# Altium schematic symbol library Sang_library.SchLib: 1607 symbols (part 11 of 15)
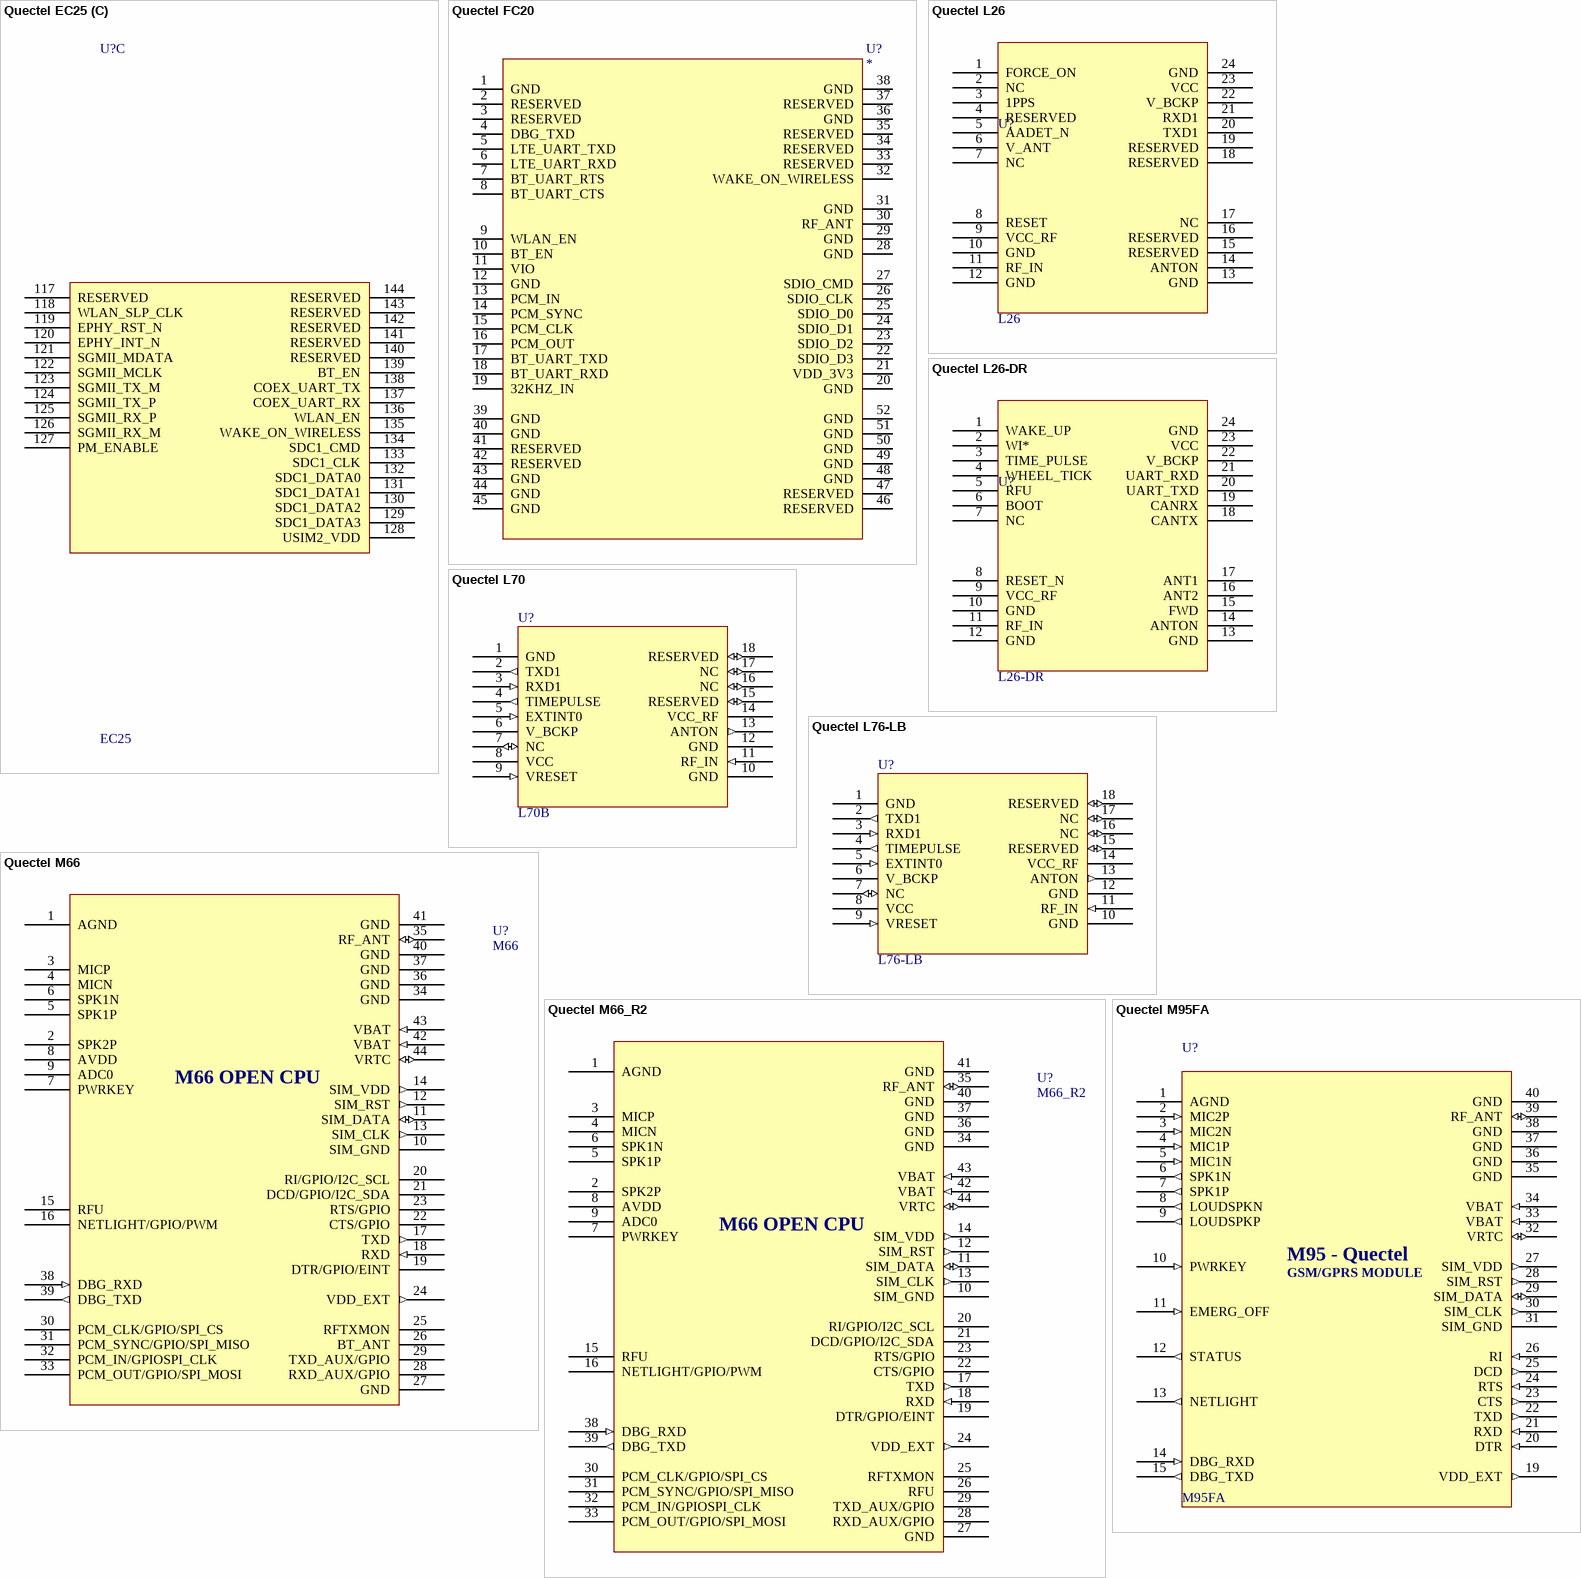
[diagram p107: symbols Quectel EC25 to Quectel M95FA]

## Quectel L26-DR
designator U?, comment L26-DR
GNSS Module Quectel L26-DR; Solder: SMT; Value: L26-DR; MPN: L26-DR; MFR: Quectel; Category: MODULE; PinCount: 24
footprint QUECTEL_L26 (Footprint not found)
pins: 1 WAKE_UP, 2 WI*, 3 TIME_PULSE, 4 WHEEL_TICK, 5 RFU, 6 BOOT, 7 NC, 8 RESET_N, 9 VCC_RF, 10 GND, 11 RF_IN, 12 GND, 13 GND, 14 ANTON, 15 FWD, 16 ANT2, 17 ANT1, 18 CANTX, 19 CANRX, 20 UART_TXD, 21 UART_RXD, 22 V_BCKP, 23 VCC, 24 GND

## Quectel L70
designator U?, comment L70B
GPS Module L70B, Quectel; Solder: SMT; Value: L70B; MPN: L70B; Category: MODULE
footprint GPS.L70
pins: 1 GND (power), 2 TXD1 (out), 3 RXD1 (in), 4 TIMEPULSE (out), 5 EXTINT0 (in), 6 V_BCKP (power), 7 NC (io), 8 VCC (power), 9 VRESET (in), 10 GND (power), 11 RF_IN (in), 12 GND (power), 13 ANTON (out), 14 VCC_RF (power), 15 RESERVED (io), 16 NC (io), 17 NC (io), 18 RESERVED (io)

## Quectel L76-LB
designator U?, comment L76-LB
GPS Module L76-LB, Quectel; Solder: SMT; Value: L76-LB; MPN: L76-LB; MFR: Quectel; Category: MODULE; PinCount: 18
footprint GPS.L7x (Footprint not found)
pins: 1 GND (power), 2 TXD1 (out), 3 RXD1 (in), 4 TIMEPULSE (out), 5 EXTINT0 (in), 6 V_BCKP (power), 7 NC (io), 8 VCC (power), 9 VRESET (in), 10 GND (power), 11 RF_IN (in), 12 GND (power), 13 ANTON (out), 14 VCC_RF (power), 15 RESERVED (io), 16 NC (io), 17 NC (io), 18 RESERVED (io)

## Quectel M66
designator U?, comment M66
GSM MODULE OPEN CPU; MFR: Quectel; Solder: SMT; MPN: M66; Value: M66; Category: MODULE
footprint M66
pins: 1 AGND (power), 2 SPK2P, 3 MICP, 4 MICN, 5 SPK1P, 6 SPK1N, 7 PWRKEY, 8 AVDD, 9 ADC0, 10 SIM_GND (power), 11 SIM_DATA (io), 12 SIM_RST (out), 13 SIM_CLK (out), 14 SIM_VDD (out), 15 RFU, 16 NETLIGHT/GPIO/PWM, 17 TXD (out), 18 RXD (in), 19 DTR/GPIO/EINT, 20 RI/GPIO/I2C_SCL, 21 DCD/GPIO/I2C_SDA, 22 CTS/GPIO, 23 RTS/GPIO, 24 VDD_EXT (out), 25 RFTXMON, 26 BT_ANT, 27 GND, 28 RXD_AUX/GPIO, 29 TXD_AUX/GPIO, 30 PCM_CLK/GPIO/SPI_CS, 31 PCM_SYNC/GPIO/SPI_MISO, 32 PCM_IN/GPIOSPI_CLK, 33 PCM_OUT/GPIO/SPI_MOSI, 34 GND, 35 RF_ANT (io), 36 GND (power), 37 GND (power), 38 DBG_RXD (in), 39 DBG_TXD (out), 40 GND (power), 41 GND (power), 42 VBAT (in), 43 VBAT (in), 44 VRTC (io)
text: M66 OPEN CPU

## Quectel M66_R2
designator U?, comment M66_R2
GSM MODULE OPEN CPU; MFR: Quectel; Solder: SMT; MPN: M66_R2; Value: M66_R2; Category: MODULE
footprint M66
pins: 1 AGND (power), 2 SPK2P, 3 MICP, 4 MICN, 5 SPK1P, 6 SPK1N, 7 PWRKEY, 8 AVDD, 9 ADC0, 10 SIM_GND (power), 11 SIM_DATA (io), 12 SIM_RST (out), 13 SIM_CLK (out), 14 SIM_VDD (out), 15 RFU, 16 NETLIGHT/GPIO/PWM, 17 TXD (out), 18 RXD (in), 19 DTR/GPIO/EINT, 20 RI/GPIO/I2C_SCL, 21 DCD/GPIO/I2C_SDA, 22 CTS/GPIO, 23 RTS/GPIO, 24 VDD_EXT (out), 25 RFTXMON, 26 RFU, 27 GND, 28 RXD_AUX/GPIO, 29 TXD_AUX/GPIO, 30 PCM_CLK/GPIO/SPI_CS, 31 PCM_SYNC/GPIO/SPI_MISO, 32 PCM_IN/GPIOSPI_CLK, 33 PCM_OUT/GPIO/SPI_MOSI, 34 GND, 35 RF_ANT (io), 36 GND (power), 37 GND (power), 38 DBG_RXD (in), 39 DBG_TXD (out), 40 GND (power), 41 GND (power), 42 VBAT (in), 43 VBAT (in), 44 VRTC (io)
text: M66 OPEN CPU

## Quectel M95FA
designator U?, comment M95FA
Quectel GSM & GPRS Module; Solder: SMT; MPN: M95FA; Value: M95FA; Category: MODULE
footprint M95FA
pins: 1 AGND (power), 2 MIC2P (in), 3 MIC2N (in), 4 MIC1P (in), 5 MIC1N (in), 6 SPK1N (out), 7 SPK1P (out), 8 LOUDSPKN (out), 9 LOUDSPKP (out), 10 PWRKEY (in), 11 EMERG_OFF (in), 12 STATUS (out), 13 NETLIGHT (out), 14 DBG_RXD (in), 15 DBG_TXD (out), 19 VDD_EXT (out), 20 DTR (in), 21 RXD (in), 22 TXD (out), 23 CTS (out), 24 RTS (in), 25 DCD (out), 26 RI (in), 27 SIM_VDD (out), 28 SIM_RST (out), 29 SIM_DATA (io), 30 SIM_CLK (out), 31 SIM_GND (power), 32 VRTC (io), 33 VBAT (in), 34 VBAT (in), 35 GND (power), 36 GND (power), 37 GND (power), 38 GND (power), 39 RF_ANT (io), 40 GND (power), 41 RESERVED (io) hidden, 42 RESERVED (io) hidden
text: M95 - Quectel; GSM/GPRS MODULE

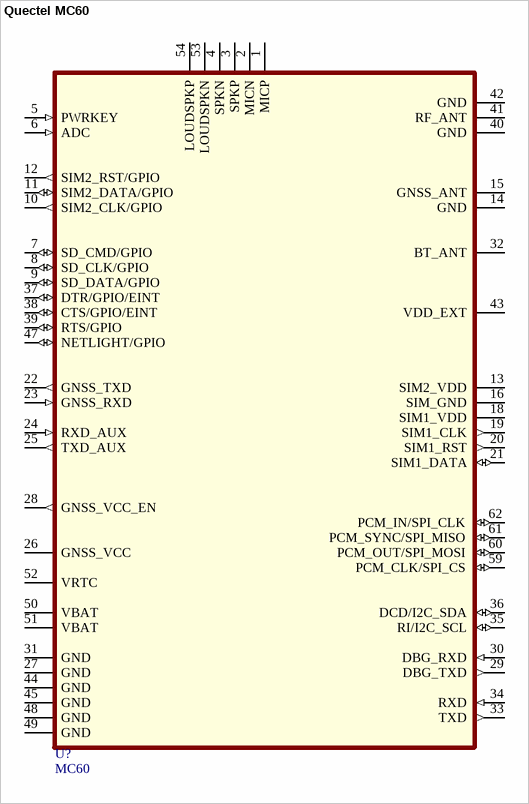
[diagram p65: symbol Quectel MC60]

## Quectel MC60
designator U?, comment MC60
GSM GNSS Module; Solder: SMT; MPN: MC60; Value: MC60; Category: MODULE
footprint MC60
pins: 1 MICP, 2 MICN, 3 SPKP, 4 SPKN, 5 PWRKEY (in), 6 ADC (in), 7 SD_CMD/GPIO (io), 8 SD_CLK/GPIO (io), 9 SD_DATA/GPIO (io), 10 SIM2_CLK/GPIO (out), 11 SIM2_DATA/GPIO (io), 12 SIM2_RST/GPIO (out), 13 SIM2_VDD (power), 14 GND (power), 15 GNSS_ANT, 16 SIM_GND (power), 18 SIM1_VDD (power), 19 SIM1_CLK (out), 20 SIM1_RST (out), 21 SIM1_DATA (io), 22 GNSS_TXD (out), 23 GNSS_RXD (in), 24 RXD_AUX (in), 25 TXD_AUX (out), 26 GNSS_VCC (power), 27 GND (power), 28 GNSS_VCC_EN (out), 29 DBG_TXD (out), 30 DBG_RXD (in), 31 GND (power), 32 BT_ANT, 33 TXD (out), 34 RXD (in), 35 RI/I2C_SCL (io), 36 DCD/I2C_SDA (io), 37 DTR/GPIO/EINT (io), 38 CTS/GPIO/EINT (io), 39 RTS/GPIO (io), 40 GND (power), 41 RF_ANT, 42 GND (power), 43 VDD_EXT, 44 GND (power), 45 GND (power), 47 NETLIGHT/GPIO (io), 48 GND (power), 49 GND (power), 50 VBAT (power), 51 VBAT (power), 52 VRTC (power), 53 LOUDSPKN, 54 LOUDSPKP, 59 PCM_CLK/SPI_CS (io), 60 PCM_OUT/SPI_MOSI (io), 61 PCM_SYNC/SPI_MISO (io), 62 PCM_IN/SPI_CLK (io)

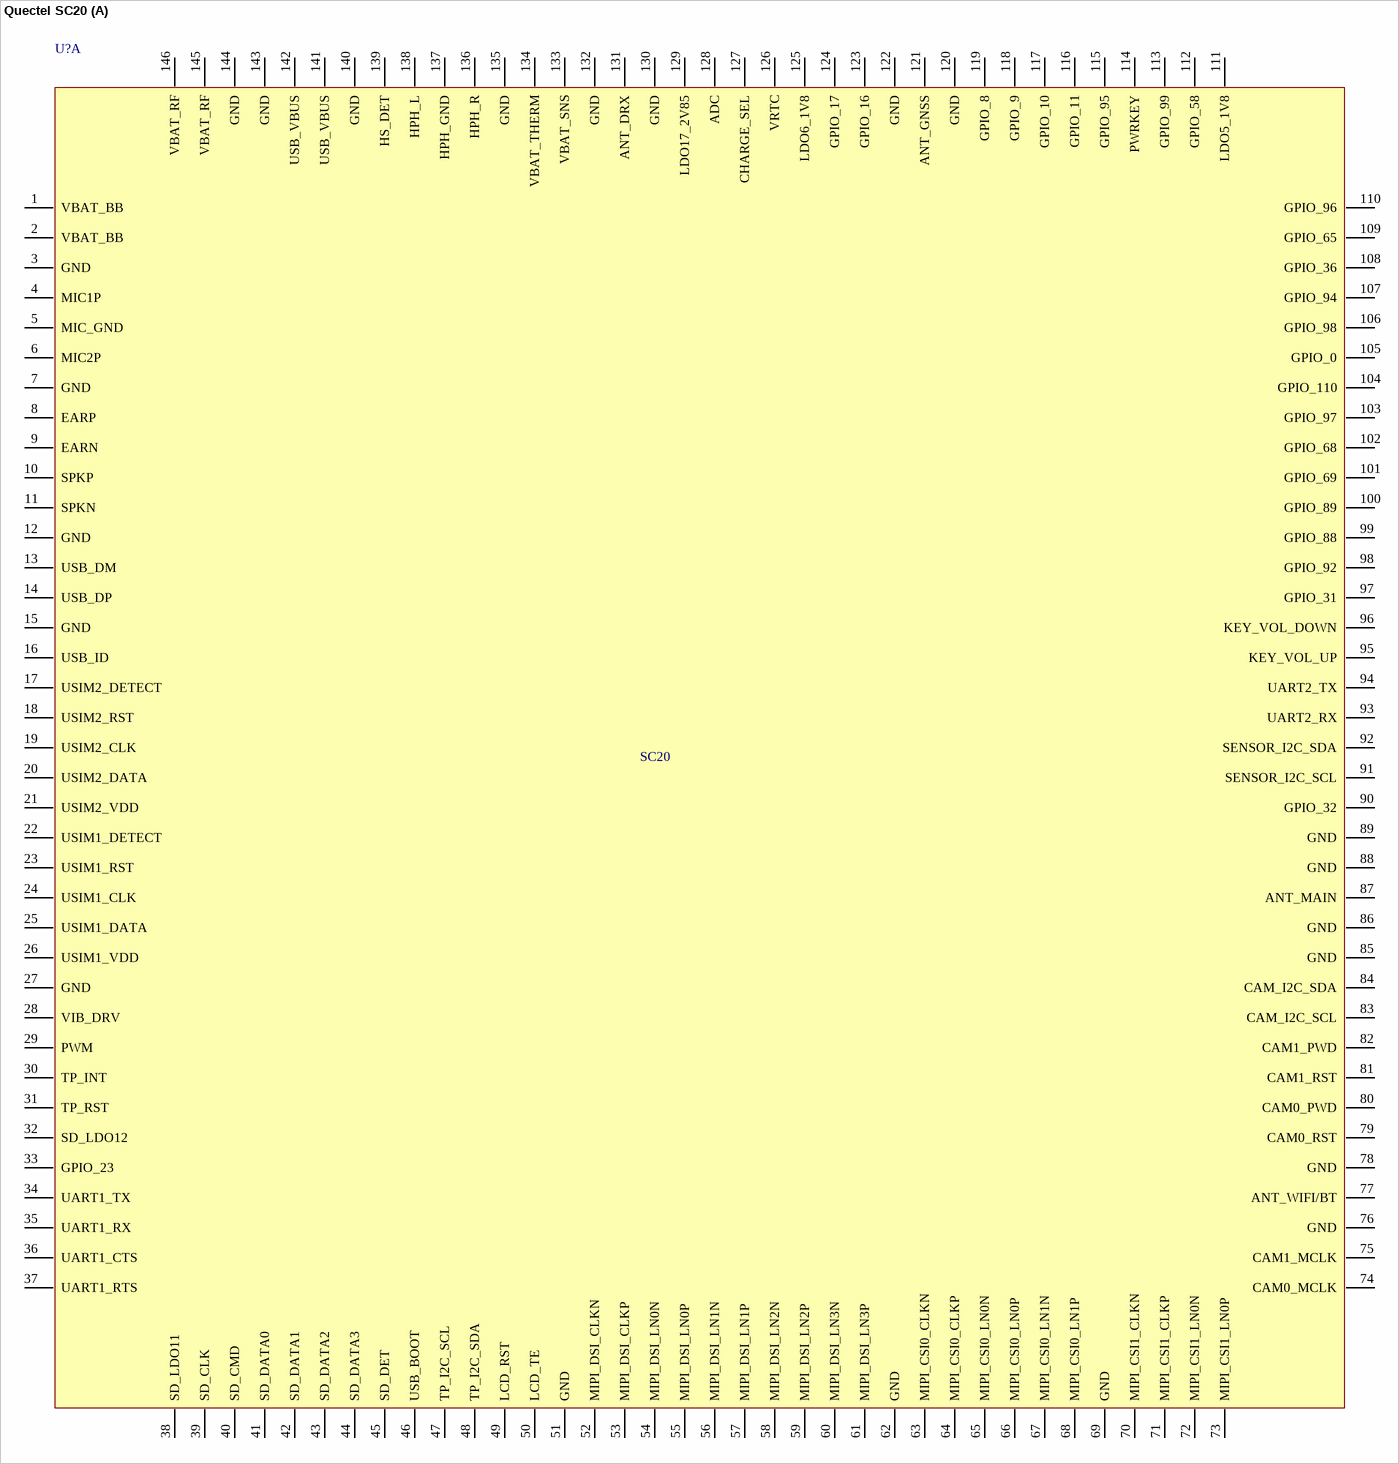
[diagram p66: symbol Quectel SC20]

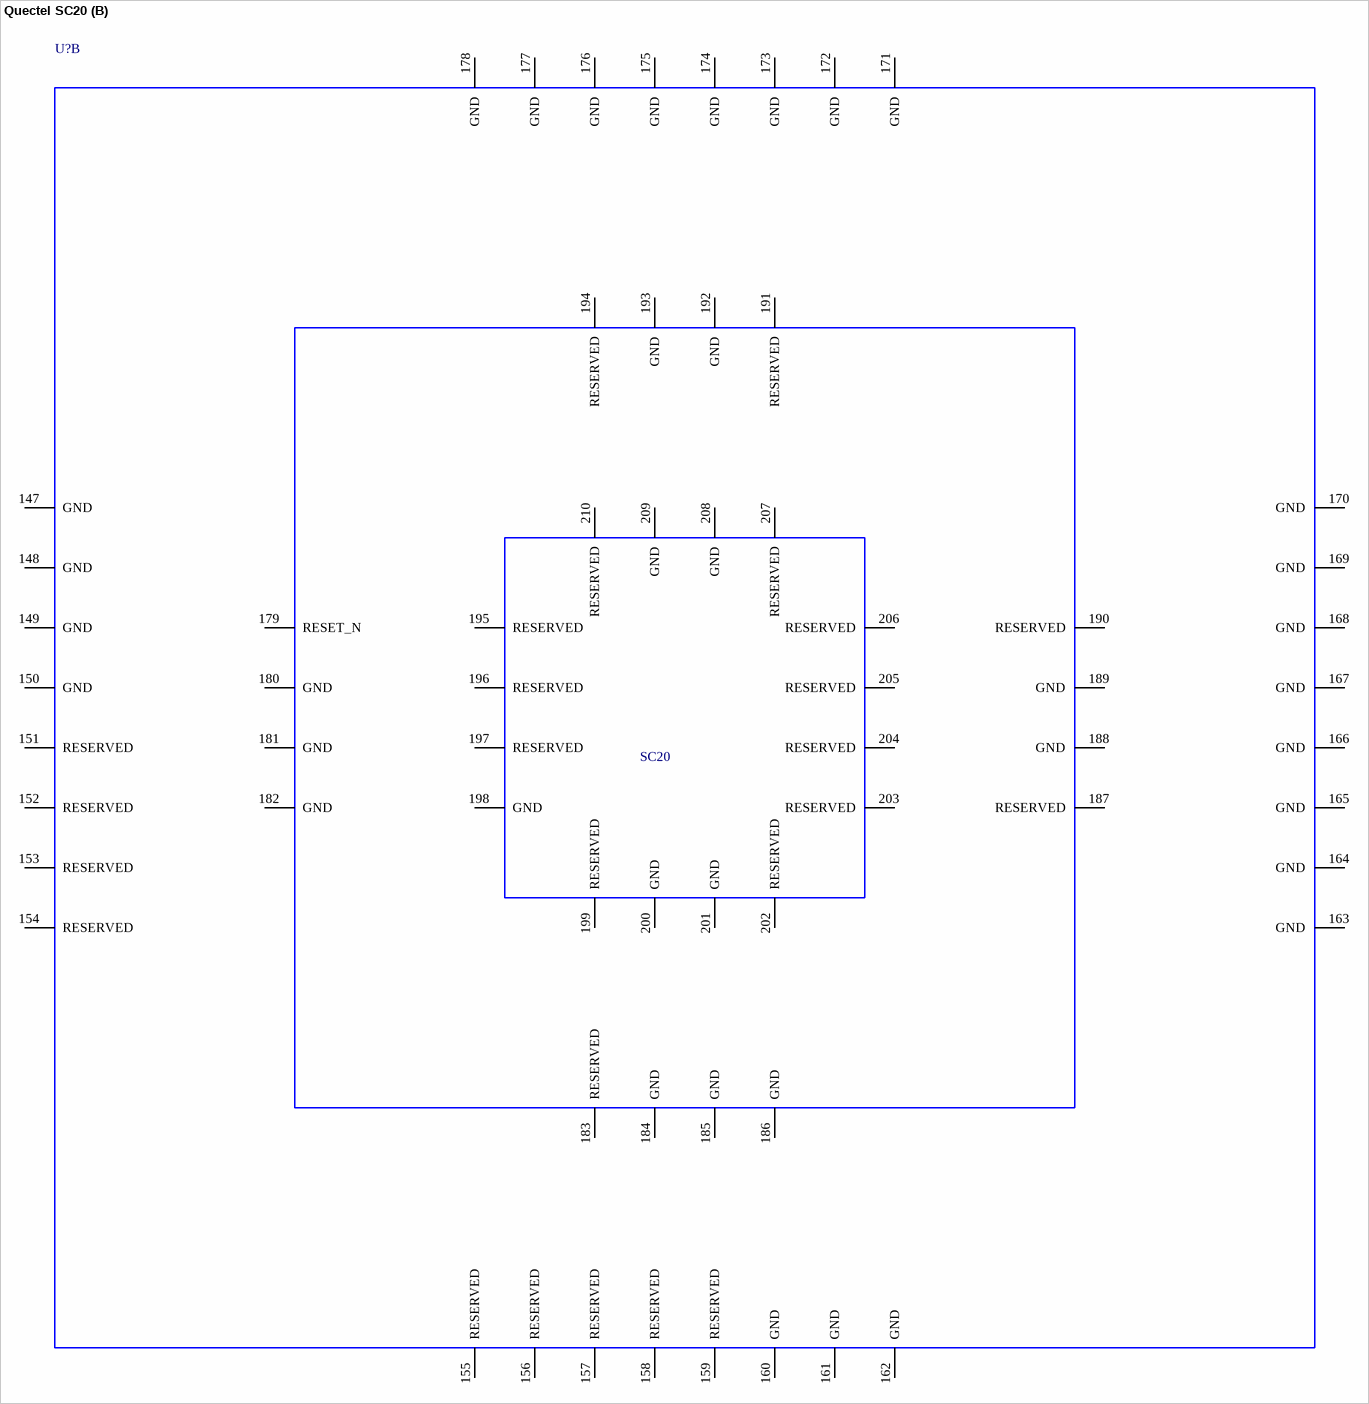
[diagram p67: symbol Quectel SC20]

## Quectel SC20
designator U?, comment SC20
Value: SC20A; Solder: SMT; MPN: SC20A; Category: MODULE
part A pins: 1 VBAT_BB, 2 VBAT_BB, 3 GND, 4 MIC1P, 5 MIC_GND, 6 MIC2P, 7 GND, 8 EARP, 9 EARN, 10 SPKP, 11 SPKN, 12 GND, 13 USB_DM, 14 USB_DP, 15 GND, 16 USB_ID, 17 USIM2_DETECT, 18 USIM2_RST, 19 USIM2_CLK, 20 USIM2_DATA, 21 USIM2_VDD, 22 USIM1_DETECT, 23 USIM1_RST, 24 USIM1_CLK, 25 USIM1_DATA, 26 USIM1_VDD, 27 GND, 28 VIB_DRV, 29 PWM, 30 TP_INT, 31 TP_RST, 32 SD_LDO12, 33 GPIO_23, 34 UART1_TX, 35 UART1_RX, 36 UART1_CTS, 37 UART1_RTS, 38 SD_LDO11, 39 SD_CLK, 40 SD_CMD, 41 SD_DATA0, 42 SD_DATA1, 43 SD_DATA2, 44 SD_DATA3, 45 SD_DET, 46 USB_BOOT, 47 TP_I2C_SCL, 48 TP_I2C_SDA, 49 LCD_RST, 50 LCD_TE, 51 GND, 52 MIPI_DSI_CLKN, 53 MIPI_DSI_CLKP, 54 MIPI_DSI_LN0N, 55 MIPI_DSI_LN0P, 56 MIPI_DSI_LN1N, 57 MIPI_DSI_LN1P, 58 MIPI_DSI_LN2N, 59 MIPI_DSI_LN2P, 60 MIPI_DSI_LN3N, 61 MIPI_DSI_LN3P, 62 GND, 63 MIPI_CSI0_CLKN, 64 MIPI_CSI0_CLKP, 65 MIPI_CSI0_LN0N, 66 MIPI_CSI0_LN0P, 67 MIPI_CSI0_LN1N, 68 MIPI_CSI0_LN1P, 69 GND, 70 MIPI_CSI1_CLKN, 71 MIPI_CSI1_CLKP, 72 MIPI_CSI1_LN0N, 73 MIPI_CSI1_LN0P, 74 CAM0_MCLK, 75 CAM1_MCLK, 76 GND, 77 ANT_WIFI/BT, 78 GND, 79 CAM0_RST, 80 CAM0_PWD, 81 CAM1_RST, 82 CAM1_PWD, 83 CAM_I2C_SCL, 84 CAM_I2C_SDA, 85 GND, 86 GND, 87 ANT_MAIN, 88 GND, 89 GND, 90 GPIO_32, 91 SENSOR_I2C_SCL, 92 SENSOR_I2C_SDA, 93 UART2_RX, 94 UART2_TX, 95 KEY_VOL_UP, 96 KEY_VOL_DOWN, 97 GPIO_31, 98 GPIO_92, 99 GPIO_88, 100 GPIO_89, 101 GPIO_69, 102 GPIO_68, 103 GPIO_97, 104 GPIO_110, 105 GPIO_0, 106 GPIO_98, 107 GPIO_94, 108 GPIO_36, 109 GPIO_65, 110 GPIO_96, 111 LDO5_1V8, 112 GPIO_58, 113 GPIO_99, 114 PWRKEY, 115 GPIO_95, 116 GPIO_11, 117 GPIO_10, 118 GPIO_9, 119 GPIO_8, 120 GND, 121 ANT_GNSS, 122 GND, 123 GPIO_16, 124 GPIO_17, 125 LDO6_1V8, 126 VRTC, 127 CHARGE_SEL, 128 ADC, 129 LDO17_2V85, 130 GND, 131 ANT_DRX, 132 GND, 133 VBAT_SNS, 134 VBAT_THERM, 135 GND, 136 HPH_R, 137 HPH_GND, 138 HPH_L, 139 HS_DET, 140 GND, 141 USB_VBUS, 142 USB_VBUS, 143 GND, 144 GND, 145 VBAT_RF, 146 VBAT_RF
part B pins: 147 GND, 148 GND, 149 GND, 150 GND, 151 RESERVED, 152 RESERVED, 153 RESERVED, 154 RESERVED, 155 RESERVED, 156 RESERVED, 157 RESERVED, 158 RESERVED, 159 RESERVED, 160 GND, 161 GND, 162 GND, 163 GND, 164 GND, 165 GND, 166 GND, 167 GND, 168 GND, 169 GND, 170 GND, 171 GND, 172 GND, 173 GND, 174 GND, 175 GND, 176 GND, 177 GND, 178 GND, 179 RESET_N, 180 GND, 181 GND, 182 GND, 183 RESERVED, 184 GND, 185 GND, 186 GND, 187 RESERVED, 188 GND, 189 GND, 190 RESERVED, 191 RESERVED, 192 GND, 193 GND, 194 RESERVED, 195 RESERVED, 196 RESERVED, 197 RESERVED, 198 GND, 199 RESERVED, 200 GND, 201 GND, 202 RESERVED, 203 RESERVED, 204 RESERVED, 205 RESERVED, 206 RESERVED, 207 RESERVED, 208 GND, 209 GND, 210 RESERVED

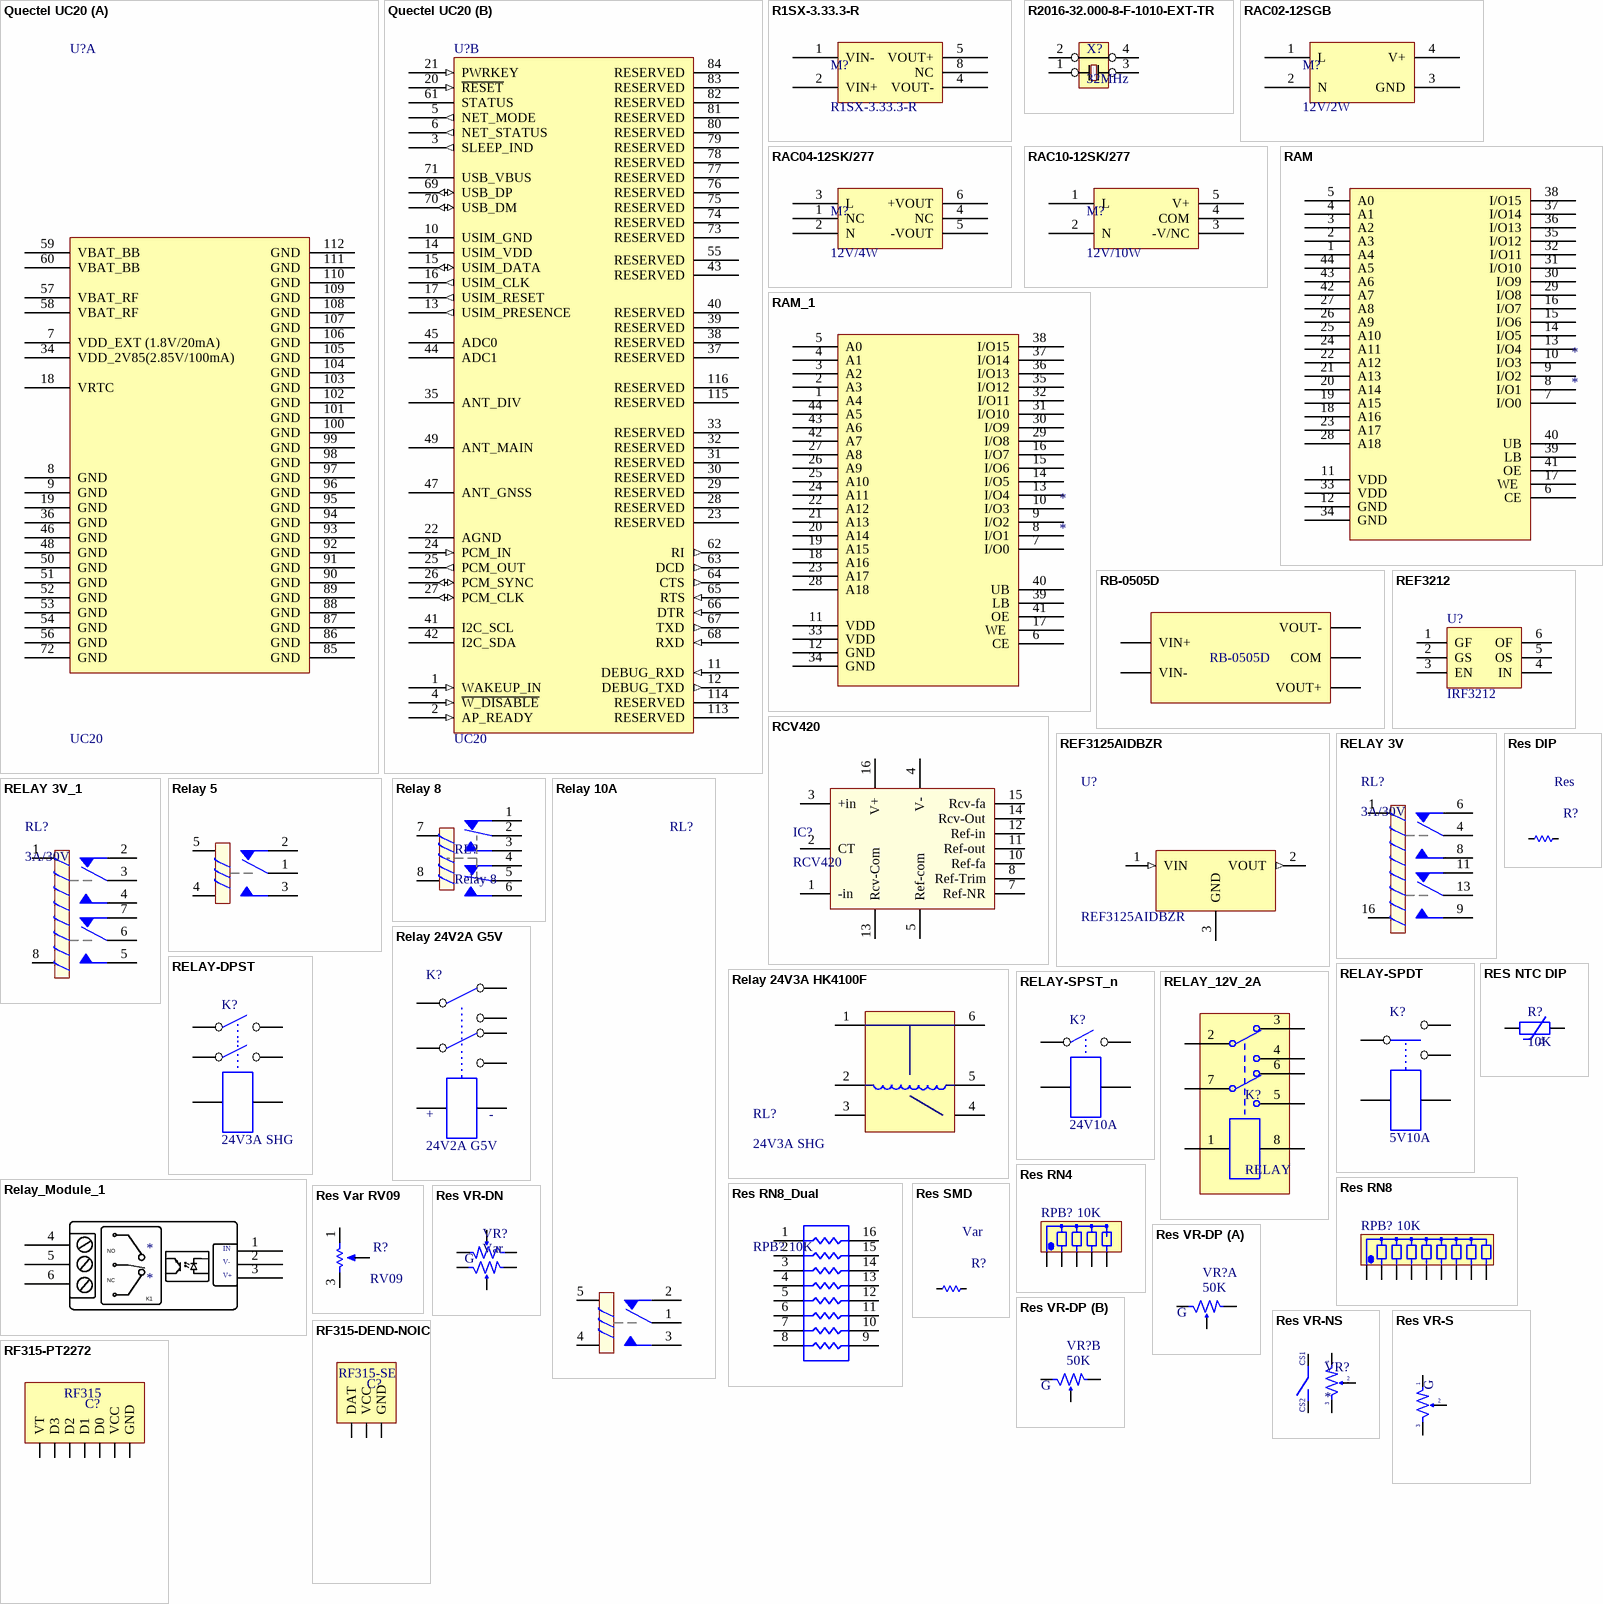
[diagram p68: symbols Quectel UC20 to RF315-PT2272]

## Quectel UC20
designator U?, comment UC20
Value: UC20A; Solder: SMT; MPN: UC20A; Category: MODULE
footprint QUECTEL_UC20 (Footprint not found)
part A pins: 7 VDD_EXT (1.8V/20mA) (power), 8 GND (power), 9 GND (power), 18 VRTC (power), 19 GND (power), 34 VDD_2V85(2.85V/100mA) (power), 36 GND (power), 46 GND (power), 48 GND (power), 50 GND (power), 51 GND (power), 52 GND (power), 53 GND (power), 54 GND (power), 56 GND (power), 57 VBAT_RF (power), 58 VBAT_RF (power), 59 VBAT_BB (power), 60 VBAT_BB (power), 72 GND (power), 85 GND (power), 86 GND (power), 87 GND (power), 88 GND (power), 89 GND (power), 90 GND (power), 91 GND (power), 92 GND (power), 93 GND (power), 94 GND (power), 95 GND (power), 96 GND (power), 97 GND (power), 98 GND (power), 99 GND (power), 100 GND (power), 101 GND (power), 102 GND (power), 103 GND (power), 104 GND (power), 105 GND (power), 106 GND (power), 107 GND (power), 108 GND (power), 109 GND (power), 110 GND (power), 111 GND (power), 112 GND (power)
part B pins: 1 WAKEUP_IN (in), 2 AP_READY (in), 3 SLEEP_IND (out), 4 ~{W_DISABLE} (in), 5 NET_MODE (out), 6 NET_STATUS (out), 10 USIM_GND (power), 11 DEBUG_RXD (in), 12 DEBUG_TXD (out), 13 USIM_PRESENCE (out), 14 USIM_VDD (power), 15 USIM_DATA (io), 16 USIM_CLK (out), 17 USIM_RESET (out), 20 ~{RESET} (in), 21 PWRKEY (in), 22 AGND (power), 23 RESERVED, 24 PCM_IN (in), 25 PCM_OUT (out), 26 PCM_SYNC (io), 27 PCM_CLK (io), 28 RESERVED, 29 RESERVED, 30 RESERVED, 31 RESERVED, 32 RESERVED, 33 RESERVED, 35 ANT_DIV, 37 RESERVED, 38 RESERVED, 39 RESERVED, 40 RESERVED, 41 I2C_SCL (oe), 42 I2C_SDA (oe), 43 RESERVED, 44 ADC1 (hiz) "0.2V-4.2V", 45 ADC0 (hiz) "0.2V-2.1V", 47 ANT_GNSS, 49 ANT_MAIN, 55 RESERVED, 61 STATUS (oe), 62 RI (out), 63 DCD (out), 64 CTS (out), 65 RTS (in), 66 DTR (in), 67 TXD (out), 68 RXD (in), 69 USB_DP (io), 70 USB_DM (io), 71 USB_VBUS (power), 73 RESERVED, 74 RESERVED, 75 RESERVED, 76 RESERVED, 77 RESERVED, 78 RESERVED, 79 RESERVED, 80 RESERVED, 81 RESERVED, 82 RESERVED, 83 RESERVED, 84 RESERVED, 113 RESERVED, 114 RESERVED, 115 RESERVED, 116 RESERVED

## R1SX-3.33.3-R
designator M?
DC DC CONVERTER 3.3V 1W; MFR: Recom Power; Solder: WAVE; MPN: R1SX-3.33.3-R; Value: R1SX-3.33.3-R; Category: MODULE; PinCount: 4
footprint R1SX-XXX (Footprint not found)
pins: 1 VIN-, 2 VIN+, 4 VOUT-, 5 VOUT+, 8 NC
1 alternate drawing of the same symbol

## R2016-32.000-8-F-1010-EXT-TR
designator X?, comment 32MHz
XTAL 32MHZ 8PF SMD; MPN: R2016-32.000-8-F-1010-EXT-TR; MPR: Raltron Electronics; Sloder: SMT; Value: 32MHz; Category: CRYSTAL
footprint CRYSTAL-XRCGB27M120F3M10R0 (2x1.6) (Crystal 2x1.6mm)
pins: 1, 2, 3, 4

## RAC02-12SGB
designator M?, comment 12V/2W
AC/DC CONVERTER 12V 2W; MPN: RAC02-12SGB; Solder: WAVE; Value: 12V/2W; Category: MODULE; PinCount: 4
footprint RAC02-12SGB (Footprint not found)
pins: 1 L, 2 N, 3 GND, 4 V+
1 alternate drawing of the same symbol

## RAC04-12SK/277
designator M?, comment 12V/4W
AC/DC CONVERTER 12V 4W; MPN: RAC04-12SK/277; Solder: WAVE; Value: 12V/4W; Category: MODULE; PinCount: 6
footprint RAC04-12SK/277 (Footprint not found)
pins: 1 NC, 2 N, 3 L, 4 NC, 5 -VOUT, 6 +VOUT
1 alternate drawing of the same symbol

## RAC10-12SK/277
designator M?, comment 12V/10W
AC/DC CONVERTER 12V 10W; MPN: RAC10-12SK/277; Solder: WAVE; Value: 12V/10W; Category: MODULE; PinCount: 5
footprint RAC10-12SK/277
pins: 1 L, 2 N, 3 -V/NC, 4 COM, 5 V+
1 alternate drawing of the same symbol

## RAM
designator *
pins: 1 A4, 2 A3, 3 A2, 4 A1, 5 A0, 6 CE, 7 I/O0, 8 I/O1, 9 I/O2, 10 I/O3, 11 VDD, 12 GND, 13 I/O4, 14 I/O5, 15 I/O6, 16 I/O7, 17 WE , 18 A16, 19 A15, 20 A14, 21 A13, 22 A12, 23 A17, 24 A11, 25 A10, 26 A9, 27 A8, 28 A18, 29 I/O8, 30 I/O9, 31 I/O10, 32 I/O11, 33 VDD, 34 GND, 35 I/O12, 36 I/O13, 37 I/O14, 38 I/O15, 39 LB, 40 UB, 41 OE, 42 A7, 43 A6, 44 A5

## RAM_1
designator *
pins: 1 A4, 2 A3, 3 A2, 4 A1, 5 A0, 6 CE, 7 I/O0, 8 I/O1, 9 I/O2, 10 I/O3, 11 VDD, 12 GND, 13 I/O4, 14 I/O5, 15 I/O6, 16 I/O7, 17 WE , 18 A16, 19 A15, 20 A14, 21 A13, 22 A12, 23 A17, 24 A11, 25 A10, 26 A9, 27 A8, 28 A18, 29 I/O8, 30 I/O9, 31 I/O10, 32 I/O11, 33 VDD, 34 GND, 35 I/O12, 36 I/O13, 37 I/O14, 38 I/O15, 39 LB, 40 UB, 41 OE, 42 A7, 43 A6, 44 A5

## RB-0505D
designator ?  (value not drawn)
footprint RB-0505D
pins: 1 VIN+, 2 VIN-, 3 VOUT-, 4 COM, 5 VOUT+

## RCV420
designator IC?
Precision 4mA to 20mA  CURRENT LOOP RECEIVER; Designed by: VanDungEvn; Value: RCV420
footprint DIP16
pins: 1 -in, 2 CT, 3 +in, 4 V-, 5 Ref-com, 7 Ref-NR, 8 Ref-Trim, 10 Ref-fa, 11 Ref-out, 12 Ref-in, 13 Rcv-Com, 14 Rcv-Out, 15 Rcv-fa, 16 V+

## REF3125AIDBZR
designator U?
IC VREF SERIES 0.2% SOT23-3; MFR: Texas Instruments; Solder: SMT; MPN: REF3125AIDBZR; Value: REF3125AIDBZR; Category: IC; PinCount: 3
footprint SOT23_3 (SOT23, 3-Leads, Body 2,90x2,30mm, Pitch 0,95mm, IPC Medium Density)
pins: 1 VIN (in), 2 VOUT (out), 3 GND

## REF3212
designator U?, comment IRF3212
Company: Texas Instrumention
footprint SOT23-6
pins: 1 GF, 2 GS, 3 EN, 4 IN, 5 OS, 6 OF

## RELAY 3V
designator RL?, comment 3A/30V
RELAY dual switch, coil 3V; MPN: HFD2-003-M-L1; Solder: WAVE; Value: 3A/30V
footprint RELAY 3V
pins: 1 V+, 4 COm1, 6 NC1, 8 NO1, 9 NO2, 11 NC2, 13 COM2, 16 V-

## RELAY 3V_1
designator RL?, comment 3A/30V
RELAY dual switch, coil 3V; MPN: HFD4V/-03-L-NiL-NiL; Solder: WAVE; Value: 3A/30V
footprint RELAY 3V-1A
pins: 1 V+, 2 NC1, 3 COm1, 4 NO1, 5 NO2, 6 COM2, 7 NC2, 8 V-
